# Altium footprint library PcbLib1.PcbLib: 157 footprints (part 4 of 10)
Each footprint in its own frame and in the unit in brackets; x right, y up, seen from the top. Pads: shape width x height; smd on the part's side, far side on the other; paste and mask are expansions set on the pad; w line width, h text height; cw(c..) or ccw(c..) is an arc to the next point about the centre after c.
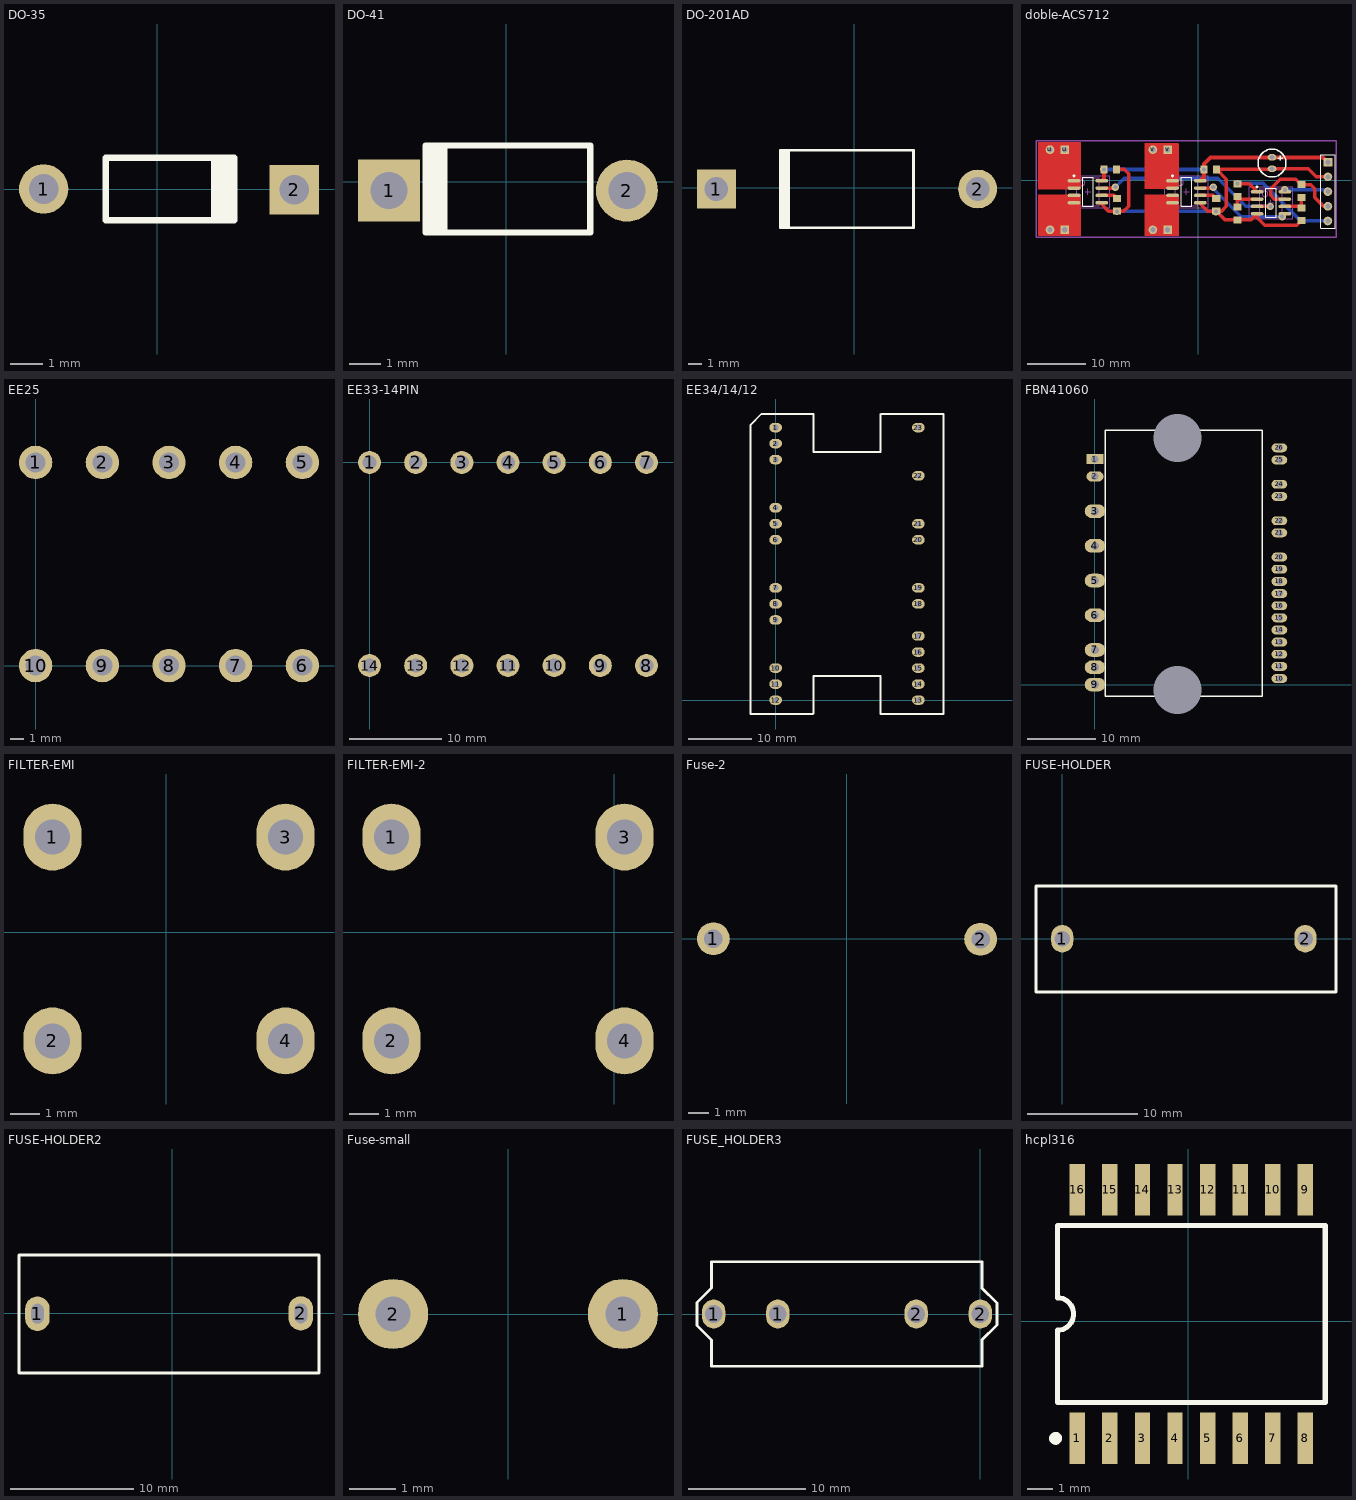
[diagram p3: the footprints below, top view; thin cyan lines are the x and y axes]

## DO-35 [mm]
pads (2):
  round 1.5 hole 0.9: 1(-3.454,0)
  rect 1.5x1.5 hole 0.9: 2(4.166,-0.025)
Top Overlay:
  rectangle: 1.631,-0.95 2.431,0.95
  lines w0.2: 2.331,-0.95 -1.569,-0.95 -1.569,0.95 2.331,0.95
3D body "User Library-DO-35G-30.STEP": height 1.82, standoff -2, extent -3.73,-0.901 4.44,0.901

## DO-41 [mm]
pads (2):
  rect 2x2 hole 1.2: 1(-3.785,-0.279)
  round 2 hole 1.2: 2(3.886,-0.279)
Top Overlay:
  region: -1.899,1.171 -2.699,1.171 -2.699,-1.629 -1.899,-1.629
  lines w0.2: -2.599,-1.629 2.701,-1.629 2.701,1.171 -2.599,1.171
3D body "User Library-DO-41-30.STEP": height 2.53, standoff -2, extent -4.109,-1.429 4.211,0.973

## DO-201AD [mm]
pads (2):
  rect 2.8x2.8 hole 1.7: 1(-9.953,-0.076)
  round 2.8 hole 1.7: 2(8.887,-0.076)
Top Overlay:
  region: -4.633,2.724 -5.433,2.724 -5.433,-2.876 -4.633,-2.876
  lines w0.2: -5.333,-2.876 4.267,-2.876 4.267,2.724 -5.333,2.724
3D body "User Library-DO-201ADDO-27.STEP": height 5.82, standoff -3.8, extent -10.68,-2.896 9.46,2.744

## doble-ACS712 [mm]
pads (55):
  oval 2.2x0.6 smd: 1(-21.458,-0.059) 1(-4.44,-0.059) 1(10.165,-1.964) 2(-21.458,-1.329) 2(-4.44,-1.329) 2(10.165,-3.234) 3(-21.458,-2.599) 3(-4.44,-2.599) 3(10.165,-4.504) 4(-21.458,-3.869) 4(-4.44,-3.869) 4(10.165,-5.774) 5(-16.658,-3.869) 5(0.36,-3.869) 5(14.965,-5.774) 6(-16.658,-2.599) 6(0.36,-2.599) 6(14.965,-4.504) 7(-16.658,-1.329) 7(0.36,-1.329) 7(14.965,-3.234) 8(-16.658,-0.059) 8(0.36,-0.059) 8(14.965,-1.964)
  rect 1.2x1.4 smd: 1(-14.097,1.899) 1(3.175,1.899) 2(-16.297,1.899) 2(0.975,1.899)
  rect 1.4x1.2 smd: 1(-14.029,-5.322) 1(3.116,-5.322) 1(6.774,-6.821) 1(6.774,-0.607) 1(17.823,-6.948) 1(17.823,-0.734) 2(-14.029,-3.122) 2(3.116,-3.122) 2(6.774,-4.621) 2(6.774,-2.807) 2(17.823,-4.748) 2(17.823,-2.934)
  oval 1.5x1.1 hole 0.8: 1(12.743,3.982) 2(12.743,2.001)
  rect 1.5x1.5 hole 0.9: +5(22.395,3.144) u(-23.071,5.303) uf(-23.071,-8.54) v(-5.291,5.303) vf(-5.291,-8.54)
  round 1.5 hole 0.9: +24(22.395,-1.936) GND(22.395,0.604) S1(22.395,-7.016) S2(22.395,-4.476) u(-25.611,5.303) uf(-25.611,-8.54) v(-7.831,5.303) vf(-7.831,-8.54)
via 14.485,-6.254 diameter 1.27 hole 0.711
via 6.774,-0.539 diameter 1.27 hole 0.711
via 14.965,-1.619 diameter 1.27 hole 0.711
via 2.583,-1.174 diameter 1.27 hole 0.711
via -14.308,-1.174 diameter 1.27 hole 0.711
via -14.054,-5.365 diameter 1.27 hole 0.711
via -16.297,1.899 diameter 1.27 hole 0.711
via 0.975,1.899 diameter 1.27 hole 0.711
via 3.04,-5.398 diameter 1.27 hole 0.711
via 12.461,-4.504 diameter 1.27 hole 0.711
Top Layer:
  region: -20.277,-1.428 -20.404,-1.555 -27.643,-1.555 -27.643,6.573 -20.277,6.573
  region: -20.277,-2.483 -20.277,-9.556 -27.643,-9.556 -27.643,-2.444 -20.404,-2.444 -20.394,-2.434
  region: -3.386,-9.556 -9.228,-9.556 -9.228,-2.444 -3.386,-2.444
  region: -3.386,6.319 -3.386,-1.428 -9.228,-1.428 -9.228,6.446 -3.513,6.446
  lines w0.6: -16.658,-3.869 -16.658,-4.158 -15.494,-5.322 -14.054,-5.322 ; -16.658,-2.599 -14.552,-2.599 -14.029,-3.122 ; -16.658,-1.329 -14.463,-1.329 -14.308,-1.174 ; -14.097,1.899 -12.809,1.899 -12.022,1.112 -12.022,-4.476 -12.911,-5.365 -14.054,-5.365 ; 0.36,-3.869 0.36,-4.031 1.651,-5.322 3.116,-5.322 ; 0.36,-2.599 2.593,-2.599 3.116,-3.122 ; 0.36,-1.329 2.682,-1.329 2.837,-1.174 2.583,-1.174 ; 3.04,-5.398 3.116,-5.322 ; 6.774,-4.621 6.774,-2.807 7.201,-3.234 10.165,-3.234 ; 6.774,-0.607 8.808,-0.607 10.165,-1.964 ; 10.165,-4.504 12.461,-4.504 ; 14.485,-6.254 14.965,-5.774 ; 14.965,-4.504 17.579,-4.504 17.823,-4.748 17.823,-2.934 ; 14.965,-3.234 13.152,-3.234 12.489,-2.571 12.489,-1.428 14.14,0.223 16.866,0.223 17.823,-0.734 19.415,-0.734 20.109,-1.428 20.109,-2.952 21.633,-4.476 22.395,-4.476 ; 14.965,-1.964 14.965,-1.619 ; 17.823,-6.948 16.993,-7.778 11.473,-7.778 10.165,-6.47 10.165,-5.774 9.118,-6.821 6.774,-6.821 4.615,-6.821 3.116,-5.322 ; 22.395,0.604 20.363,0.604 18.966,2.001 12.743,2.001 12.641,1.899 3.175,1.899 4.869,0.205 4.869,-4.476 4.023,-5.322 3.116,-5.322
  lines w0.7: -16.658,-0.059 -16.297,0.302 -16.297,1.899 ; 0.36,-0.059 0.975,0.556 0.975,1.899 0.975,2.806 2.151,3.982 12.743,3.982 21.557,3.982 22.395,3.144
Bottom Layer:
  lines w0.6: -14.308,-1.174 -12.784,0.35 3.345,0.35 8.199,-4.504 12.461,-4.504 ; -14.054,-5.365 3.007,-5.365 3.04,-5.398 ; 2.583,-1.174 2.583,-1.428 7.409,-6.254 14.485,-6.254 ; 6.774,-0.539 11.219,-0.539 17.696,-7.016 22.395,-7.016 ; 14.965,-1.619 22.078,-1.619 22.395,-1.936
  lines w0.7: -16.297,1.899 0.975,1.899
Top Overlay:
  circle w0.25: c-21.458,0.791 r0.125
  circle w0.25: c10.165,-1.114 r0.125
  circle w0.25: c-4.44,0.791 r0.125
  circle w0.254: c12.743,2.992 r2.4
  lines w0.2: -19.958,-4.464 -19.958,0.536 -18.158,0.536 -18.158,-4.464 -19.958,-4.464 ; -2.94,-4.464 -2.94,0.536 -1.14,0.536 -1.14,-4.464 -2.94,-4.464 ; 11.665,-6.369 11.665,-1.369 13.465,-1.369 13.465,-6.369 11.665,-6.369 ; 21.125,-8.286 21.125,4.414 23.665,4.414 23.665,-8.286 21.125,-8.286
  lines w0.254: 13.759,3.83 14.572,3.83 ; 14.165,3.449 14.165,4.211
Bottom Overlay:
  lines w0.2: -26.881,-9.81 -26.881,-7.27 -21.801,-7.27 -21.801,-9.81 -26.881,-9.81 ; -26.881,4.033 -26.881,6.573 -21.801,6.573 -21.801,4.033 -26.881,4.033 ; -9.101,-9.81 -9.101,-7.27 -4.021,-7.27 -4.021,-9.81 -9.101,-9.81 ; -9.101,4.033 -9.101,6.573 -4.021,6.573 -4.021,4.033 -9.101,4.033
Mechanical 13:
  circle w0.1: c-20.108,-0.414 r0.5
  circle w0.1: c11.515,-2.319 r0.5
  circle w0.1: c-3.09,-0.414 r0.5
  lines w0.1: -21.008,-4.414 -21.008,0.486 -17.108,0.486 -17.108,-4.414 -21.008,-4.414 ; -3.99,-4.414 -3.99,0.486 -0.09,0.486 -0.09,-4.414 -3.99,-4.414 ; 10.615,-6.319 10.615,-1.419 14.515,-1.419 14.515,-6.319 10.615,-6.319
  lines w0.254: -28.024,-9.81 23.792,-9.81 23.792,6.827 -28.024,6.827 -28.024,-9.81
Mechanical 15:
  lines w0.1: -19.558,-1.964 -18.558,-1.964 ; -19.058,-2.464 -19.058,-1.464 ; -2.54,-1.964 -1.54,-1.964 ; -2.04,-2.464 -2.04,-1.464 ; 12.065,-3.869 13.065,-3.869 ; 12.565,-4.369 12.565,-3.369 ; -22.808,-4.714 -22.808,0.786 -15.308,0.786 -15.308,-4.714 -22.808,-4.714 ; -5.79,-4.714 -5.79,0.786 1.71,0.786 1.71,-4.714 -5.79,-4.714 ; 8.815,-6.619 8.815,-1.119 16.315,-1.119 16.315,-6.619 8.815,-6.619
3D body "User Library-User Library-0805(2012M) Cap.STEP": height 1.24, standoff -0.05, extent -16.247,1.254 -14.247,2.544
3D body "User Library-User Library-0805(2012M) Cap.STEP": height 1.24, standoff -0.05, extent -14.674,-5.172 -13.384,-3.172
3D body "User Library-User Library-0805(2012M) Cap.STEP": height 1.24, standoff -0.05, extent 1.025,1.254 3.025,2.544
3D body "User Library-User Library-0805(2012M) Cap.STEP": height 1.24, standoff -0.05, extent 2.471,-5.172 3.761,-3.172
3D body "User Library-Header_Male_2Pin.STEP": height 8.54, standoff -3, extent -26.881,4.058 -21.801,6.548
3D body "User Library-Header_Male_2Pin.STEP": height 8.54, standoff -3, extent -26.881,-9.785 -21.801,-7.295
3D body "User Library-Header_Male_2Pin.STEP": height 8.54, standoff -3, extent -9.101,4.058 -4.021,6.548
3D body "User Library-Header_Male_2Pin.STEP": height 8.54, standoff -3, extent -9.101,-9.785 -4.021,-7.295
3D body "User Library-RESC2012X___.STEP": height 0.7, standoff 0, extent 6.174,-6.746 7.374,-4.746
3D body "User Library-RESC2012X___.STEP": height 0.7, standoff 0, extent 6.174,-2.682 7.374,-0.682
3D body "User Library-RESC2012X___.STEP": height 0.7, standoff 0, extent 17.223,-6.873 18.423,-4.873
3D body "User Library-RESC2012X___.STEP": height 0.7, standoff 0, extent 17.223,-2.809 18.423,-0.809
3D body "User Library-so8-3.STEP": height 1.7, standoff 0, extent -22.033,-4.414 -16.033,0.486
3D body "User Library-so8-3.STEP": height 1.7, standoff 0, extent 9.59,-6.319 15.59,-1.419
3D body "User Library-so8-3.STEP": height 1.7, standoff 0, extent -5.015,-4.414 0.985,0.486
3D body "User Library-ECAP5_12_20.STEP": height 12, standoff -2.3, extent 10.245,0.492 15.241,5.492

## EE25 [mm]
pads (10):
  round 2.5 hole 1.5: 1(0,15.25) 2(5,15.25) 3(10,15.25) 4(15,15.25) 5(20,15.25) 6(20,0) 7(15,0) 8(10,0) 9(5,0) 10(0,0)
3D body "User Library-EE25_10_6_ferrite_bobbin-1.STEP": height 22.7, standoff -3.1, extent -2.625,-2.675 22.575,17.925

## EE33-14PIN [mm]
pads (14):
  round 2.5 hole 1.5: 1(0,0) 2(5,0) 3(10,0) 4(15,0) 5(20,0) 6(25,0) 7(30,0) 8(30,-22) 9(25,-22) 10(20,-22) 11(15,-22) 12(10,-22) 13(5,-22) 14(0,-22)

## EE34/14/12 [mm]
pads (23):
  oval 2x1.5 hole 0.9: 1(0,43.18) 2(0,40.64) 3(0,38.1) 4(0,30.48) 5(0,27.94) 6(0,25.4) 7(0,17.78) 8(0,15.24) 9(0,12.7) 10(0,5.08) 11(0,2.54) 12(0,0) 13(22.6,0) 14(22.6,2.54) 15(22.6,5.08) 16(22.6,7.62) 17(22.6,10.16) 18(22.6,15.24) 19(22.6,17.78) 20(22.6,25.4) 21(22.6,27.94) 22(22.6,35.56) 23(22.6,43.18)
Top Overlay:
  lines w0.3: 5.95,-2.195 -4,-2.195 -4,43.58 -2.25,45.33 6,45.33 6,39.33 16.6,39.33 16.6,45.28 16.65,45.33 26.6,45.33 26.6,-2.195 16.6,-2.195 16.6,3.805 6,3.805 6,-2.145

## FBN41060 [mm]
pads (28):
  round 0 hole 7: 0(12.1,-0.8) 0(12.1,36.125)
  rect 2.5x1.5 hole 1.1: 1(0,33.02)
  oval 2.5x1.5 hole 1.1: 2(0,30.48)
  oval 3x2 hole 1.2: 3(0,25.4) 4(0,20.32) 5(0,15.24) 6(0,10.16) 7(0,5.08) 8(0,2.54) 9(0,0)
  oval 2.3x1.3 hole 1: 10(27,0.889) 11(27,2.667) 12(27,4.445) 13(27,6.223) 14(27,8.001) 15(27,9.779) 16(27,11.557) 17(27,13.335) 18(27,15.113) 19(27,16.891) 20(27,18.669) 21(27,22.225) 22(27,24.003) 23(27,27.559) 24(27,29.337) 25(27,32.893) 26(27,34.671)
Top Overlay:
  lines w0.2: 1.5,-1.72 24.5,-1.72 24.5,37.28 1.5,37.28 1.5,-1.72
3D body "User Library-FNB41060.STEP": height 8.25, standoff -1.75, extent -0.202,-1.749 27.198,37.251

## FILTER-EMI [mm]
pads (4):
  oval 2x2.3 hole 1.2: 1(-3.9,3.275) 2(-3.9,-3.725) 3(4.1,3.275) 4(4.1,-3.725)
3D body "User Library-emi filter-1.STEP": height 16.34, standoff -2.66, extent -7.625,-5.475 7.875,5.025

## FILTER-EMI-2 [mm]
pads (4):
  oval 2x2.3 hole 1.2: 1(-7.65,3.275) 2(-7.65,-3.725) 3(0.35,3.275) 4(0.35,-3.725)
3D body "User Library-UF9_8.STEP": height 15.3, standoff -3, extent -11.801,-5.575 4.356,5.025

## Fuse-2 [mm]
pads (2):
  round 1.6 hole 0.9: 1(-6.5,0) 2(6.5,-0.025)
3D body "User Library-FUSE 251010.STEP": height 3.4, standoff -1.5, extent -5.317,-1.397 5.318,1.397

## FUSE-HOLDER [mm]
pads (2):
  oval 2x2.5 hole 1.4: 1(0,0) 2(22,0)
Top Overlay:
  lines w0.254: -2.375,-4.825 24.775,-4.825 24.775,4.775 -2.375,4.775 -2.375,-4.825
3D body "User Library-BLX-A Fuse Holder.STEP": height 13.07, standoff -4, extent -2.375,-4.825 24.803,4.775

## FUSE-HOLDER2 [mm]
pads (2):
  oval 2x2.8 hole 1 slot 1.6 at 90 deg: 1(-10.975,-0.05) 2(10.45,-0.025)
Top Overlay:
  lines w0.254: -12.475,-4.875 -12.475,4.725 11.925,4.725 11.925,-4.875 -12.475,-4.875
3D body "User Library-Fuse_Holder_FH-101-1.STEP": height 11, standoff -4, extent -12.4,-4.85 11.9,4.75

## Fuse-small [mil]
pads (2):
  round 60 hole 30: 1(98.43,0) 2(-98.43,0)
3D body "User Library-Fuse 3_6x10.STEP": height 500.07, standoff -118.11, extent -111.7,-77 175.7,76.54

## FUSE_HOLDER3 [mm]
pads (4):
  oval 2x2.5 hole 1.5: 1(-22.85,0) 1(-17.35,0) 2(-5.5,0) 2(0,0)
Top Overlay:
  lines w0.254: -24.275,-0.987 -23.025,-2.237 -23.025,-4.475 0.125,-4.475 0.125,-2.237 1.425,-0.937 1.425,0.937 0.125,2.237 0.125,4.475 -23.025,4.475 -23.025,2.237 -24.275,0.987 -24.275,-0.987
3D body "User Library-Fuse_Holder.STEP": height 14.44, standoff -4.4, extent -23.03,-4.525 0.13,4.475

## hcpl316 [mm]
pads (16):
  rect 0.6x2 smd: 1(-4.332,-4.563) 2(-3.062,-4.563) 3(-1.792,-4.563) 4(-0.522,-4.563) 5(0.748,-4.563) 6(2.018,-4.563) 7(3.288,-4.563) 8(4.558,-4.563) 9(4.558,5.137) 10(3.288,5.137) 11(2.018,5.137) 12(0.748,5.137) 13(-0.522,5.137) 14(-1.792,5.137) 15(-3.062,5.137) 16(-4.332,5.137)
Top Overlay:
  circle w0.25: c-5.182,-4.563 r0.125
  lines w0.2: -5.112,-3.163 -5.112,-0.348 ccw(c-5.112,0.287) -5.112,0.922 -5.112,3.737 5.338,3.737 5.338,-3.163 -5.112,-3.163
3D body "User Library-SOIC16_Wide_JEDEC_MS-013AA.STEP": height 2.62, standoff -0.03, extent -5.15,-4.94 5.35,5.69